# Altium footprint library PcbLib.PcbLib: 428 footprints (part 15 of 27)
Each footprint in its own frame and in the unit in brackets; x right, y up, seen from the top. Pads: shape width x height; smd on the part's side, far side on the other; paste and mask are expansions set on the pad; w line width, h text height; cw(c..) or ccw(c..) is an arc to the next point about the centre after c.
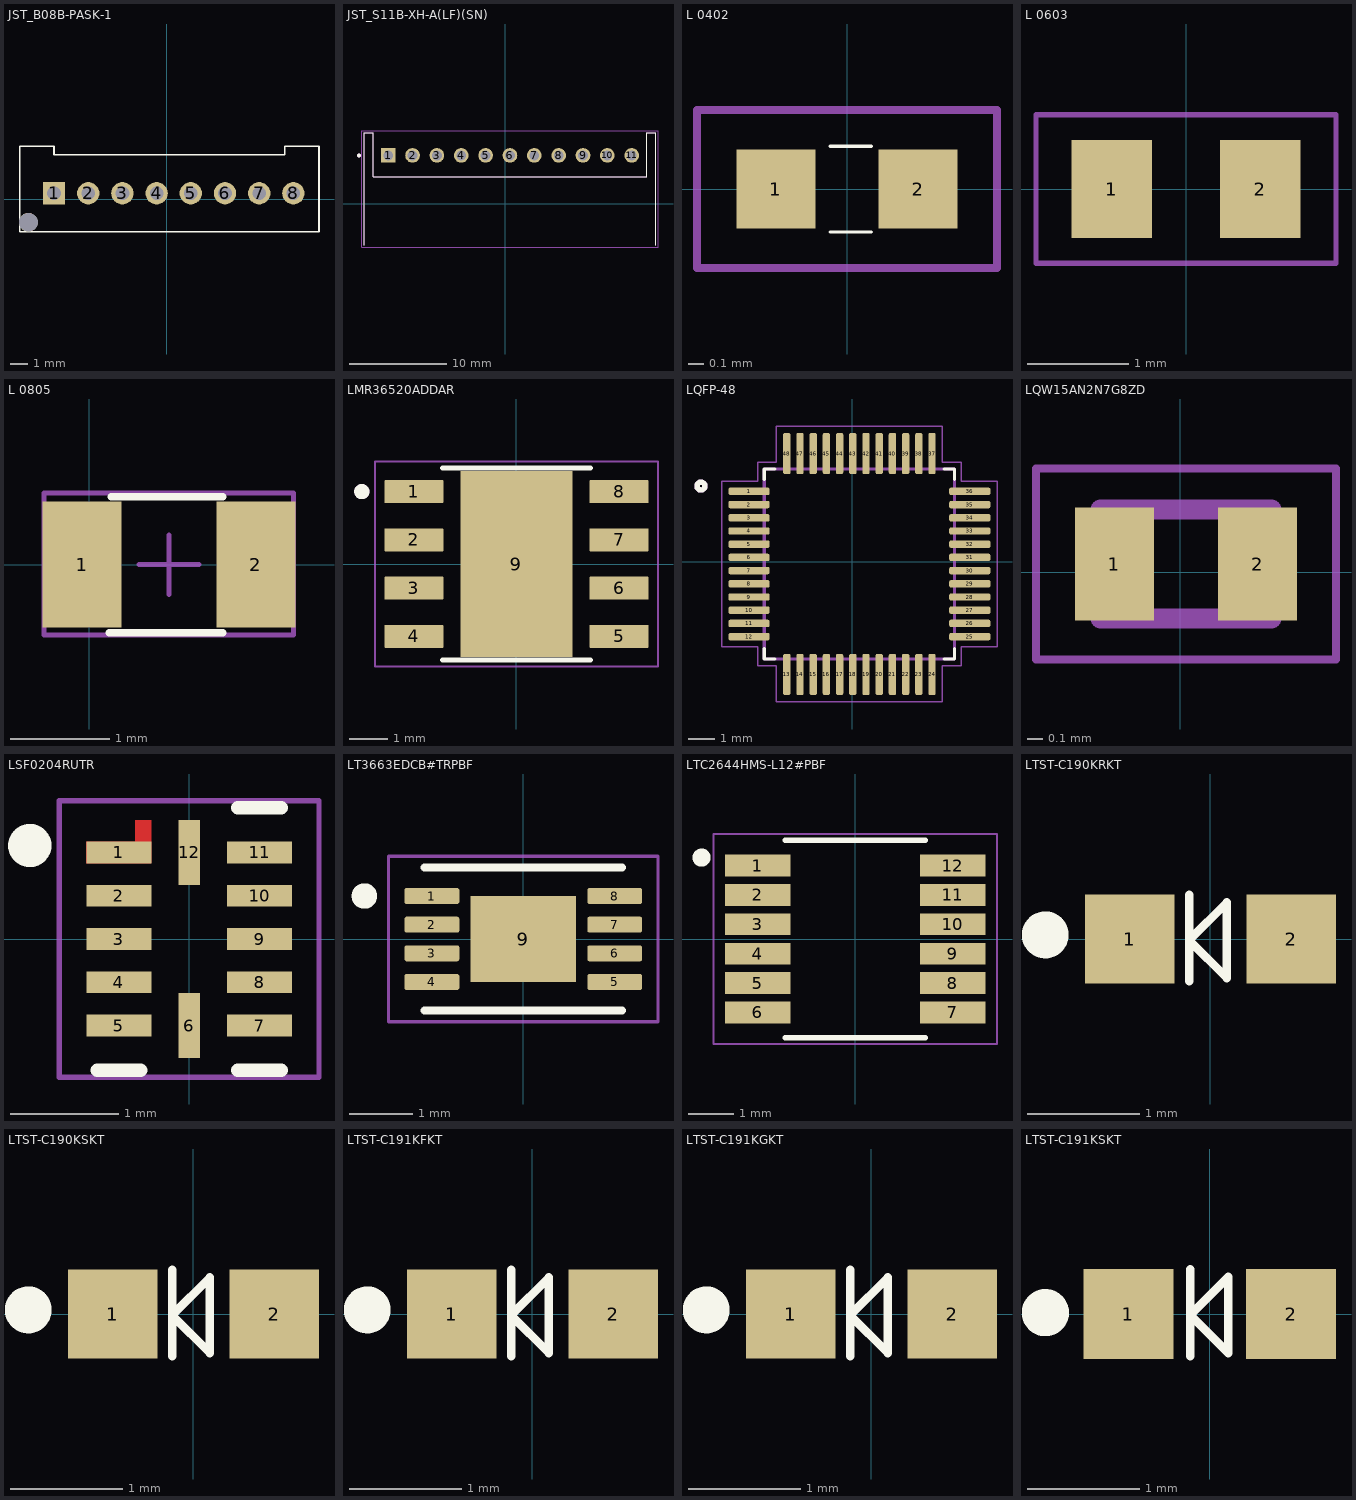
[diagram p14: the footprints below, top view; thin cyan lines are the x and y axes]

## JST_B08B-PASK-1 [mm] "Connector Header Through Hole 8 position 2mm Pitch"
pads (9):
  rect 1.308x1.308 / inner round 1.308 / far side rect 1.308x1.308 hole 0.8: 1(-6.585,0.349)
  round 1.308 hole 0.8: 2(-4.585,0.349) 3(-2.585,0.349) 4(-0.585,0.349) 5(1.415,0.349) 6(3.415,0.349) 7(5.415,0.349) 8(7.415,0.349)
  round 1.1 hole 1.1 unplated: ""(-8.085,-1.351)
Top Overlay:
  lines w0.1: -8.585,-1.901 -8.585,3.099 -6.585,3.099 -6.585,2.599 6.915,2.599 6.915,3.099 8.915,3.099 8.915,-1.901 -8.585,-1.901
3D body "step_temp.STEP": height 7.7, standoff -3, extent -8.585,-1.901 9.415,3.399

## JST_S11B-XH-A(LF)(SN) [mm]
pads (11):
  rect 1.508x1.508 / inner round 1.508 / far side rect 1.508x1.508 hole 1: 1(-12.043,4.989)
  round 1.508 hole 1: 2(-9.543,4.989) 3(-7.043,4.989) 4(-4.543,4.989) 5(-2.043,4.989) 6(0.457,4.989) 7(2.957,4.989) 8(5.457,4.989) 9(7.957,4.989) 10(10.457,4.989) 11(12.957,4.989)
Top Overlay:
  circle w0.2: c-15.043,4.989 r0.1
  lines w0.127: -14.493,-4.211 -14.493,7.289 -13.593,7.289 -13.593,2.789 14.507,2.789 14.507,7.289 15.407,7.289 15.407,-4.211
Mechanical 13:
  circle w0.2: c-15.043,4.989 r0.1
  lines w0.127: -14.493,-4.211 -14.493,7.289 -13.593,7.289 -13.593,2.789 14.507,2.789 14.507,7.289 15.407,7.289 15.407,-4.211
Mechanical 15:
  lines w0.05: -14.743,-4.461 -14.743,7.539 15.657,7.539 15.657,-4.461 -14.743,-4.461
3D body "step_temp.STEP": height 6.1, standoff -3.4, extent -14.493,-4.211 15.407,7.289

## L 0402 [mm]
height 0.55
pads (2):
  rect 0.5x0.5 smd: 1(-0.45,0) 2(0.45,0)
Top Overlay:
  lines w0.02: -0.108,-0.272 0.154,-0.272 ; -0.108,0.271 0.154,0.271
Mechanical 15:
  lines w0.05: -0.95,-0.5 0.95,-0.5 0.95,0.5 -0.95,0.5 -0.95,-0.5
3D body "MLF1005VR10JT000.STEP": height 0.55, standoff 0, extent -0.5,-0.25 0.5,0.25

## L 0603 [mm]
pads (2):
  rect 0.8x0.97 smd: 1(-0.735,0) 2(0.735,0)
Mechanical 15:
  lines w0.05: -1.485,-0.735 -1.485,0.735 1.485,0.735 1.485,-0.735 -1.485,-0.735
3D body "step_temp.STEP": height 0.95, standoff 0, extent -0.8,-0.4 0.8,0.4

## L 0805 [mm]
pads (2):
  rect 0.8x1.27 smd: 1(-0.074,0) 2(1.679,0)
Top Overlay:
  lines w0.076: 0.203,-0.686 1.346,-0.686 ; 0.221,0.686 1.346,0.686
Mechanical 15:
  lines w0.051: 0.503,0 1.103,0 ; 0.803,-0.3 0.803,0.3 ; -0.457,-0.711 -0.457,0.724 2.057,0.724 2.057,-0.711 -0.457,-0.711
3D body "MLZ2012N101LT000.step": height 1.45, standoff 0, extent -0.187,-0.625 1.813,0.625

## LMR36520ADDAR [mm]
pads (9):
  rrect5% 1.55x0.6 smd mask+0: 1(-2.7,1.905) 2(-2.7,0.635) 3(-2.7,-0.635) 4(-2.7,-1.905) 5(2.7,-1.905) 6(2.7,-0.635) 7(2.7,0.635) 8(2.7,1.905)
  rect 2.95x4.9 smd paste-3 mask+0: 9(0,0)
Top Overlay:
  circle w0.2: c-4.07,1.905 r0.1
  lines w0.127: -1.95,-2.525 1.95,-2.525 ; -1.95,2.525 1.95,2.525
Top Paste:
  region: 1.355,-1.7 -1.355,-1.7 -1.355,1.7 1.355,1.7
Top Solder:
  drawing of 9 lines, arcs and shapes, not listed
Mechanical 13:
  circle w0.2: c-4.07,1.905 r0.1
Mechanical 15:
  lines w0.05: -3.725,-2.7 3.725,-2.7 3.725,2.7 -3.725,2.7 -3.725,-2.7
3D body "step_temp.STEP": height 1.7, standoff 0, extent -3,-2.45 3,2.45

## LQFP-48 [mm]
pads (48):
  rrect50% 1.56x0.28 smd: 1(-3.901,2.674) 2(-3.901,2.174) 3(-3.901,1.674) 4(-3.901,1.174) 5(-3.901,0.674) 6(-3.901,0.174) 7(-3.901,-0.326) 8(-3.901,-0.826) 9(-3.901,-1.326) 10(-3.901,-1.826) 11(-3.901,-2.326) 12(-3.901,-2.826) 25(4.459,-2.826) 26(4.459,-2.326) 27(4.459,-1.826) 28(4.459,-1.326) 29(4.459,-0.826) 30(4.459,-0.326) 31(4.459,0.174) 32(4.459,0.674) 33(4.459,1.174) 34(4.459,1.674) 35(4.459,2.174) 36(4.459,2.674)
  rrect50% 0.28x1.56 smd: 13(-2.471,-4.256) 14(-1.971,-4.256) 15(-1.471,-4.256) 16(-0.971,-4.256) 17(-0.471,-4.256) 18(0.029,-4.256) 19(0.529,-4.256) 20(1.029,-4.256) 21(1.529,-4.256) 22(2.029,-4.256) 23(2.529,-4.256) 24(3.029,-4.256) 37(3.029,4.104) 38(2.529,4.104) 39(2.029,4.104) 40(1.529,4.104) 41(1.029,4.104) 42(0.529,4.104) 43(0.029,4.104) 44(-0.471,4.104) 45(-0.971,4.104) 46(-1.471,4.104) 47(-1.971,4.104) 48(-2.471,4.104)
Top Overlay:
  circle w0.2: c-5.721,2.874 r0.15
  lines w0.127: -3.321,-3.286 -3.321,-3.676 -2.931,-3.676 ; -3.321,3.134 -3.321,3.524 -2.931,3.524 ; 3.489,-3.676 3.879,-3.676 3.879,-3.286 ; 3.489,3.524 3.879,3.524 3.879,3.134
Mechanical 13:
  circle w0.2: c-5.721,2.874 r0.15
  lines w0.127: -3.321,-3.676 -3.321,3.524 3.879,3.524 3.879,-3.676 -3.321,-3.676
Mechanical 15:
  lines w0.05: -4.931,-3.216 -4.931,3.064 -3.571,3.064 -3.571,3.774 -2.861,3.774 -2.861,5.134 3.419,5.134 3.419,3.774 4.129,3.774 4.129,3.064 5.489,3.064 5.489,-3.216 4.129,-3.216 4.129,-3.926 3.419,-3.926 3.419,-5.286 -2.861,-5.286 -2.861,-3.926 -3.571,-3.926 -3.571,-3.216 -4.931,-3.216
3D body "step_temp.STEP": height 1.6, standoff 0, extent -4.221,-4.576 4.779,4.424

## LQW15AN2N7G8ZD [mm]
pads (2):
  rect 0.51x0.73 smd: 1(-0.425,0.053) 2(0.495,0.053)
Mechanical 13:
  lines w0.127: -0.515,-0.297 -0.515,0.403 0.585,0.403 0.585,-0.297 -0.515,-0.297
Mechanical 15:
  lines w0.05: -0.93,-0.562 -0.93,0.668 1,0.668 1,-0.562 -0.93,-0.562

## LSF0204RUTR [mm]
pads (12):
  rect 0.6x0.2 smd: 1(-0.65,0.8) 2(-0.65,0.4) 3(-0.65,0) 4(-0.65,-0.4) 5(-0.65,-0.8) 7(0.65,-0.8) 8(0.65,-0.4) 9(0.65,0) 10(0.65,0.4) 11(0.65,0.8)
  rect 0.2x0.6 smd: 6(0,-0.8) 12(0,0.8)
Top Layer:
  region: -0.35,0.7 -0.95,0.7 -0.95,0.9 -0.5,0.9 -0.5,1.1 -0.35,1.1
Top Overlay:
  circle w0.2: c-1.473,0.864 r0.1
  lines w0.127: -0.85,-1.214 -0.45,-1.214 ; 0.45,-1.214 0.85,-1.214 ; 0.45,1.214 0.85,1.214
Mechanical 15:
  lines w0.05: -1.2,-1.277 -1.2,1.277 1.2,1.277 1.2,-1.277 -1.2,-1.277
3D body "LSF0204DRUTR.STEP": height 0.55, standoff 0, extent -0.85,-1 0.85,1

## LT3663EDCB#TRPBF [mm]
pads (9):
  rrect25% 0.86x0.25 smd: 1(-1.435,0.675) 2(-1.435,0.225) 3(-1.435,-0.225) 4(-1.435,-0.675) 5(1.435,-0.675) 6(1.435,-0.225) 7(1.435,0.225) 8(1.435,0.675)
  rect 1.65x1.35 smd paste-2: 9(0,0)
Top Overlay:
  circle w0.2: c-2.495,0.675 r0.1
  lines w0.127: -1.55,-1.12 1.55,-1.12 ; -1.55,1.12 1.55,1.12
Top Paste:
  region: 0.52,-0.43 -0.52,-0.43 -0.52,0.43 0.52,0.43
Mechanical 15:
  lines w0.05: -2.115,-1.3 -2.115,1.3 2.115,1.3 2.115,-1.3 -2.115,-1.3
3D body "DFN-8_DCB_LIT.step": height 0.81, standoff 0, extent -1.549,-1.054 1.549,1.054

## LTC2644HMS-L12#PBF [mm]
pads (12):
  rect 1.45x0.48 smd: 1(-2.16,1.625) 2(-2.16,0.975) 3(-2.16,0.325) 4(-2.16,-0.325) 5(-2.16,-0.975) 6(-2.16,-1.625) 7(2.16,-1.625) 8(2.16,-0.975) 9(2.16,-0.325) 10(2.16,0.325) 11(2.16,0.975) 12(2.16,1.625)
Top Overlay:
  circle w0.2: c-3.4,1.8 r0.1
  lines w0.127: -1.55,-2.185 1.55,-2.185 ; -1.55,2.185 1.55,2.185
Mechanical 15:
  lines w0.05: -3.135,-2.32 3.135,-2.32 3.135,2.32 -3.135,2.32 -3.135,-2.32
3D body "MSOP-12_MS_LIT.step": height 1.09, standoff 0, extent -2.552,-2.07 2.502,2.07

## LTST-C190KRKT [mm]
pads (2):
  rect 0.8x0.8 smd: 1(-0.723,0) 2(0.723,0)
Top Overlay:
  circle w0.254: c-1.477,0.037 r0.083
  lines w0.076: -0.191,-0.378 -0.191,0.394 ; -0.191,-0.011 0.148,-0.35 0.148,0.327 -0.191,-0.011
3D body "step_temp.STEP": height 0.55, standoff 0, extent -0.8,-0.4 0.8,0.4

## LTST-C190KSKT [mm]
pads (2):
  rect 0.8x0.8 smd: 1(-0.723,0) 2(0.723,0)
Top Overlay:
  circle w0.254: c-1.477,0.037 r0.083
  lines w0.076: -0.191,-0.378 -0.191,0.394 ; -0.191,-0.011 0.148,0.327 0.148,-0.35 -0.191,-0.011
3D body "step_temp.STEP": height 0.55, standoff 0, extent -0.8,-0.4 0.8,0.4

## LTST-C191KFKT [mm]
pads (2):
  rect 0.8x0.8 smd: 1(-0.723,0) 2(0.723,0)
Top Overlay:
  circle w0.254: c-1.477,0.037 r0.083
  lines w0.076: -0.191,-0.378 -0.191,0.394 ; -0.191,-0.011 0.148,0.327 0.148,-0.35 -0.191,-0.011
3D body "step_temp.STEP": height 0.55, standoff 0, extent -0.8,-0.4 0.8,0.4

## LTST-C191KGKT [mm]
pads (2):
  rect 0.8x0.8 smd: 1(-0.723,0) 2(0.723,0)
Top Overlay:
  circle w0.254: c-1.477,0.037 r0.083
  lines w0.076: -0.191,-0.378 -0.191,0.394 ; -0.191,-0.011 0.148,-0.35 0.148,0.327 -0.191,-0.011
3D body "step_temp.STEP": height 0.55, standoff 0, extent -0.8,-0.4 0.8,0.4

## LTST-C191KSKT [mm]
pads (2):
  rect 0.8x0.8 smd: 1(-0.723,0) 2(0.723,0)
Top Overlay:
  circle w0.254: c-1.463,0.012 r0.083
  lines w0.076: -0.174,-0.376 -0.174,0.396 ; -0.174,-0.009 0.164,0.329 0.164,-0.348 -0.174,-0.009
3D body "step_temp.STEP": height 0.55, standoff 0, extent -0.8,-0.4 0.8,0.4